# Altium schematic symbol library jlcpcb_2025_04_capacitors_extended_0402.schlib: 3594 symbols (part 8 of 20) (continued)
## CC0402JRNPO0BN220
designator C?  Capacitance: 22pF  (hidden comment: *)
Capacitor, Ceramic (MLCC), 22pF, ±5%, 100V, NP0, ±5%, SMD 0402; Manufacturer: YAGEO; Manufacturer Part Number: CC0402JRNPO0BN220; Package Size: 0402; JLCPCB Basic Part: No; JLCPCB Part Number: C576701; Supplier 1: LCSC; Category: Capacitors - MLCC; Supplier Part Number 1: C576701; Tolerance: ±5%; Voltage Rating: 100V; Temperature Coefficient: NP0; RoHS: Yes; ComponentLink1Description: Datasheet; ComponentLink1URL: https://wmsc.lcsc.com/wmsc/upload/file/pdf/v2/lcsc/2311211121_YAGEO-CC0402JRNPO0BN220_C576701.pdf; ComponentLink2Description: JLCPCB Part URL; ComponentLink2URL: https://jlcpcb.com/partdetail/C576701; ComponentLink3Description: LCSC Part URL; ComponentLink3URL: https://lcsc.com/product-detail/Multilayer-Ceramic-Capacitors-MLCC---SMD-SMT_YAGEO-YAGEO-CC0402JRNPO0BN220_C576701.html
footprint CAP-0402 (0402 (1005M) Capacitor)
pins: 1, 2

## CC0402JRNPO0BN470
designator C?  Capacitance: 47pF  (hidden comment: *)
Capacitor, Ceramic (MLCC), 47pF, ±5%, 100V, NP0, ±5%, SMD 0402; Manufacturer: YAGEO; Manufacturer Part Number: CC0402JRNPO0BN470; Package Size: 0402; JLCPCB Basic Part: No; JLCPCB Part Number: C576703; Supplier 1: LCSC; Category: Capacitors - MLCC; Supplier Part Number 1: C576703; Tolerance: ±5%; Voltage Rating: 100V; Temperature Coefficient: NP0; RoHS: Yes; ComponentLink1Description: Datasheet; ComponentLink1URL: https://wmsc.lcsc.com/wmsc/upload/file/pdf/v2/lcsc/2008171233_YAGEO-CC0402JRNPO0BN470_C576703.pdf; ComponentLink2Description: JLCPCB Part URL; ComponentLink2URL: https://jlcpcb.com/partdetail/C576703; ComponentLink3Description: LCSC Part URL; ComponentLink3URL: https://lcsc.com/product-detail/Multilayer-Ceramic-Capacitors-MLCC---SMD-SMT_YAGEO-YAGEO-CC0402JRNPO0BN470_C576703.html
footprint CAP-0402 (0402 (1005M) Capacitor)
pins: 1, 2

## CC0402JRNPO7BN101
designator C?  Capacitance: 100pF  (hidden comment: *)
Capacitor, Ceramic (MLCC), 100pF, ±5%, 16V, NP0, ±5%, SMD 0402; Manufacturer: YAGEO; Manufacturer Part Number: CC0402JRNPO7BN101; Package Size: 0402; JLCPCB Basic Part: No; JLCPCB Part Number: C526991; Supplier 1: LCSC; Category: Capacitors - MLCC; Supplier Part Number 1: C526991; Tolerance: ±5%; Voltage Rating: 16V; Temperature Coefficient: NP0; RoHS: Yes; ComponentLink1Description: Datasheet; ComponentLink1URL: https://wmsc.lcsc.com/wmsc/upload/file/pdf/v2/lcsc/2005261832_YAGEO-CC0402JRNPO7BN101_C526991.pdf; ComponentLink2Description: JLCPCB Part URL; ComponentLink2URL: https://jlcpcb.com/partdetail/C526991; ComponentLink3Description: LCSC Part URL; ComponentLink3URL: https://lcsc.com/product-detail/Multilayer-Ceramic-Capacitors-MLCC---SMD-SMT_YAGEO-YAGEO-CC0402JRNPO7BN101_C526991.html
footprint CAP-0402 (0402 (1005M) Capacitor)
pins: 1, 2

## CC0402JRNPO7BN120
designator C?  Capacitance: 12pF  (hidden comment: *)
Capacitor, Ceramic (MLCC), 12pF, ±5%, 16V, NP0, ±5%, SMD 0402; Manufacturer: YAGEO; Manufacturer Part Number: CC0402JRNPO7BN120; Package Size: 0402; JLCPCB Basic Part: No; JLCPCB Part Number: C1852904; Supplier 1: LCSC; Category: Capacitors - MLCC; Supplier Part Number 1: C1852904; Tolerance: ±5%; Voltage Rating: 16V; Temperature Coefficient: NP0; RoHS: Yes; ComponentLink1Description: Datasheet; ComponentLink1URL: https://wmsc.lcsc.com/wmsc/upload/file/pdf/v2/lcsc/2201271030_YAGEO-CC0402JRNPO7BN120_C1852904.pdf; ComponentLink2Description: JLCPCB Part URL; ComponentLink2URL: https://jlcpcb.com/partdetail/C1852904; ComponentLink3Description: LCSC Part URL; ComponentLink3URL: https://lcsc.com/product-detail/Multilayer-Ceramic-Capacitors-MLCC---SMD-SMT_YAGEO-YAGEO-CC0402JRNPO7BN120_C1852904.html
footprint CAP-0402 (0402 (1005M) Capacitor)
pins: 1, 2

## CC0402JRNPO7BN220
designator C?  Capacitance: 22pF  (hidden comment: *)
Capacitor, Ceramic (MLCC), 22pF, ±5%, 16V, NP0, ±5%, SMD 0402; Manufacturer: YAGEO; Manufacturer Part Number: CC0402JRNPO7BN220; Package Size: 0402; JLCPCB Basic Part: No; JLCPCB Part Number: C2175872; Supplier 1: LCSC; Category: Capacitors - MLCC; Supplier Part Number 1: C2175872; Tolerance: ±5%; Voltage Rating: 16V; Temperature Coefficient: NP0; RoHS: Yes; ComponentLink1Description: Datasheet; ComponentLink1URL: https://wmsc.lcsc.com/wmsc/upload/file/pdf/v2/lcsc/2202040800_YAGEO-CC0402JRNPO7BN220_C2175872.pdf; ComponentLink2Description: JLCPCB Part URL; ComponentLink2URL: https://jlcpcb.com/partdetail/C2175872; ComponentLink3Description: LCSC Part URL; ComponentLink3URL: https://lcsc.com/product-detail/Multilayer-Ceramic-Capacitors-MLCC---SMD-SMT_YAGEO-YAGEO-CC0402JRNPO7BN220_C2175872.html
footprint CAP-0402 (0402 (1005M) Capacitor)
pins: 1, 2

## CC0402JRNPO7BN331
designator C?  Capacitance: 330pF  (hidden comment: *)
Capacitor, Ceramic (MLCC), 330pF, ±5%, 16V, NP0, ±5%, SMD 0402; Manufacturer: YAGEO; Manufacturer Part Number: CC0402JRNPO7BN331; Package Size: 0402; JLCPCB Basic Part: No; JLCPCB Part Number: C541368; Supplier 1: LCSC; Category: Capacitors - MLCC; Supplier Part Number 1: C541368; Tolerance: ±5%; Voltage Rating: 16V; Temperature Coefficient: NP0; RoHS: Yes; ComponentLink1Description: Datasheet; ComponentLink1URL: https://wmsc.lcsc.com/wmsc/upload/file/pdf/v2/lcsc/2006151112_YAGEO-CC0402JRNPO7BN331_C541368.pdf; ComponentLink2Description: JLCPCB Part URL; ComponentLink2URL: https://jlcpcb.com/partdetail/C541368; ComponentLink3Description: LCSC Part URL; ComponentLink3URL: https://lcsc.com/product-detail/Multilayer-Ceramic-Capacitors-MLCC---SMD-SMT_YAGEO-YAGEO-CC0402JRNPO7BN331_C541368.html
footprint CAP-0402 (0402 (1005M) Capacitor)
pins: 1, 2

## CC0402JRNPO7BN391
designator C?  Capacitance: 390pF  (hidden comment: *)
Capacitor, Ceramic (MLCC), 390pF, ±5%, 16V, NP0, ±5%, SMD 0402; Manufacturer: YAGEO; Manufacturer Part Number: CC0402JRNPO7BN391; Package Size: 0402; JLCPCB Basic Part: No; JLCPCB Part Number: C526992; Supplier 1: LCSC; Category: Capacitors - MLCC; Supplier Part Number 1: C526992; Tolerance: ±5%; Voltage Rating: 16V; Temperature Coefficient: NP0; RoHS: Yes; ComponentLink1Description: Datasheet; ComponentLink1URL: https://wmsc.lcsc.com/wmsc/upload/file/pdf/v2/lcsc/2005261832_YAGEO-CC0402JRNPO7BN391_C526992.pdf; ComponentLink2Description: JLCPCB Part URL; ComponentLink2URL: https://jlcpcb.com/partdetail/C526992; ComponentLink3Description: LCSC Part URL; ComponentLink3URL: https://lcsc.com/product-detail/Multilayer-Ceramic-Capacitors-MLCC---SMD-SMT_YAGEO-YAGEO-CC0402JRNPO7BN391_C526992.html
footprint CAP-0402 (0402 (1005M) Capacitor)
pins: 1, 2

## CC0402JRNPO7BN471
designator C?  Capacitance: 470pF  (hidden comment: *)
Capacitor, Ceramic (MLCC), 470pF, ±5%, 16V, NP0, ±5%, SMD 0402; Manufacturer: YAGEO; Manufacturer Part Number: CC0402JRNPO7BN471; Package Size: 0402; JLCPCB Basic Part: No; JLCPCB Part Number: C526993; Supplier 1: LCSC; Category: Capacitors - MLCC; Supplier Part Number 1: C526993; Tolerance: ±5%; Voltage Rating: 16V; Temperature Coefficient: NP0; RoHS: Yes; ComponentLink1Description: Datasheet; ComponentLink1URL: https://wmsc.lcsc.com/wmsc/upload/file/pdf/v2/lcsc/2006031835_YAGEO-CC0402JRNPO7BN471_C526993.pdf; ComponentLink2Description: JLCPCB Part URL; ComponentLink2URL: https://jlcpcb.com/partdetail/C526993; ComponentLink3Description: LCSC Part URL; ComponentLink3URL: https://lcsc.com/product-detail/Multilayer-Ceramic-Capacitors-MLCC---SMD-SMT_YAGEO-YAGEO-CC0402JRNPO7BN471_C526993.html
footprint CAP-0402 (0402 (1005M) Capacitor)
pins: 1, 2

## CC0402JRNPO8BN100
designator C?  Capacitance: 10pF  (hidden comment: *)
Capacitor, Ceramic (MLCC), 10pF, ±5%, 25V, NP0, ±5%, SMD 0402; Manufacturer: YAGEO; Manufacturer Part Number: CC0402JRNPO8BN100; Package Size: 0402; JLCPCB Basic Part: No; JLCPCB Part Number: C526994; Supplier 1: LCSC; Category: Capacitors - MLCC; Supplier Part Number 1: C526994; Tolerance: ±5%; Voltage Rating: 25V; Temperature Coefficient: NP0; RoHS: Yes; ComponentLink1Description: Datasheet; ComponentLink1URL: https://wmsc.lcsc.com/wmsc/upload/file/pdf/v2/lcsc/2005261832_YAGEO-CC0402JRNPO8BN100_C526994.pdf; ComponentLink2Description: JLCPCB Part URL; ComponentLink2URL: https://jlcpcb.com/partdetail/C526994; ComponentLink3Description: LCSC Part URL; ComponentLink3URL: https://lcsc.com/product-detail/Multilayer-Ceramic-Capacitors-MLCC---SMD-SMT_YAGEO-YAGEO-CC0402JRNPO8BN100_C526994.html
footprint CAP-0402 (0402 (1005M) Capacitor)
pins: 1, 2

## CC0402JRNPO8BN101
designator C?  Capacitance: 100pF  (hidden comment: *)
Capacitor, Ceramic (MLCC), 100pF, ±5%, 25V, NP0, ±5%, SMD 0402; Manufacturer: YAGEO; Manufacturer Part Number: CC0402JRNPO8BN101; Package Size: 0402; JLCPCB Basic Part: No; JLCPCB Part Number: C541358; Supplier 1: LCSC; Category: Capacitors - MLCC; Supplier Part Number 1: C541358; Tolerance: ±5%; Voltage Rating: 25V; Temperature Coefficient: NP0; RoHS: Yes; ComponentLink1Description: Datasheet; ComponentLink1URL: https://wmsc.lcsc.com/wmsc/upload/file/pdf/v2/lcsc/2006151111_YAGEO-CC0402JRNPO8BN101_C541358.pdf; ComponentLink2Description: JLCPCB Part URL; ComponentLink2URL: https://jlcpcb.com/partdetail/C541358; ComponentLink3Description: LCSC Part URL; ComponentLink3URL: https://lcsc.com/product-detail/Multilayer-Ceramic-Capacitors-MLCC---SMD-SMT_YAGEO-YAGEO-CC0402JRNPO8BN101_C541358.html
footprint CAP-0402 (0402 (1005M) Capacitor)
pins: 1, 2

## CC0402JRNPO8BN102
designator C?  Capacitance: 1nF  (hidden comment: *)
Capacitor, Ceramic (MLCC), 1nF, ±5%, 25V, NP0, ±5%, SMD 0402; Manufacturer: YAGEO; Manufacturer Part Number: CC0402JRNPO8BN102; Package Size: 0402; JLCPCB Basic Part: No; JLCPCB Part Number: C526995; Supplier 1: LCSC; Category: Capacitors - MLCC; Supplier Part Number 1: C526995; Tolerance: ±5%; Voltage Rating: 25V; Temperature Coefficient: NP0; RoHS: Yes; ComponentLink1Description: Datasheet; ComponentLink1URL: https://wmsc.lcsc.com/wmsc/upload/file/pdf/v2/lcsc/2005141733_YAGEO-CC0402JRNPO8BN102_C526995.pdf; ComponentLink2Description: JLCPCB Part URL; ComponentLink2URL: https://jlcpcb.com/partdetail/C526995; ComponentLink3Description: LCSC Part URL; ComponentLink3URL: https://lcsc.com/product-detail/Multilayer-Ceramic-Capacitors-MLCC---SMD-SMT_YAGEO-YAGEO-CC0402JRNPO8BN102_C526995.html
footprint CAP-0402 (0402 (1005M) Capacitor)
pins: 1, 2

## CC0402JRNPO8BN150
designator C?  Capacitance: 15pF  (hidden comment: *)
Capacitor, Ceramic (MLCC), 15pF, ±5%, 25V, NP0, ±5%, SMD 0402; Manufacturer: YAGEO; Manufacturer Part Number: CC0402JRNPO8BN150; Package Size: 0402; JLCPCB Basic Part: No; JLCPCB Part Number: C541359; Supplier 1: LCSC; Category: Capacitors - MLCC; Supplier Part Number 1: C541359; Tolerance: ±5%; Voltage Rating: 25V; Temperature Coefficient: NP0; RoHS: Yes; ComponentLink1Description: Datasheet; ComponentLink1URL: https://wmsc.lcsc.com/wmsc/upload/file/pdf/v2/lcsc/2006151111_YAGEO-CC0402JRNPO8BN150_C541359.pdf; ComponentLink2Description: JLCPCB Part URL; ComponentLink2URL: https://jlcpcb.com/partdetail/C541359; ComponentLink3Description: LCSC Part URL; ComponentLink3URL: https://lcsc.com/product-detail/Multilayer-Ceramic-Capacitors-MLCC---SMD-SMT_YAGEO-YAGEO-CC0402JRNPO8BN150_C541359.html
footprint CAP-0402 (0402 (1005M) Capacitor)
pins: 1, 2

## CC0402JRNPO8BN151
designator C?  Capacitance: 150pF  (hidden comment: *)
Capacitor, Ceramic (MLCC), 150pF, ±5%, 25V, NP0, ±5%, SMD 0402; Manufacturer: YAGEO; Manufacturer Part Number: CC0402JRNPO8BN151; Package Size: 0402; JLCPCB Basic Part: No; JLCPCB Part Number: C541366; Supplier 1: LCSC; Category: Capacitors - MLCC; Supplier Part Number 1: C541366; Tolerance: ±5%; Voltage Rating: 25V; Temperature Coefficient: NP0; RoHS: Yes; ComponentLink1Description: Datasheet; ComponentLink1URL: https://wmsc.lcsc.com/wmsc/upload/file/pdf/v2/lcsc/2006151112_YAGEO-CC0402JRNPO8BN151_C541366.pdf; ComponentLink2Description: JLCPCB Part URL; ComponentLink2URL: https://jlcpcb.com/partdetail/C541366; ComponentLink3Description: LCSC Part URL; ComponentLink3URL: https://lcsc.com/product-detail/Multilayer-Ceramic-Capacitors-MLCC---SMD-SMT_YAGEO-YAGEO-CC0402JRNPO8BN151_C541366.html
footprint CAP-0402 (0402 (1005M) Capacitor)
pins: 1, 2

## CC0402JRNPO8BN180
designator C?  Capacitance: 18pF  (hidden comment: *)
Capacitor, Ceramic (MLCC), 18pF, ±5%, 25V, NP0, ±5%, SMD 0402; Manufacturer: YAGEO; Manufacturer Part Number: CC0402JRNPO8BN180; Package Size: 0402; JLCPCB Basic Part: No; JLCPCB Part Number: C541360; Supplier 1: LCSC; Category: Capacitors - MLCC; Supplier Part Number 1: C541360; Tolerance: ±5%; Voltage Rating: 25V; Temperature Coefficient: NP0; RoHS: Yes; ComponentLink1Description: Datasheet; ComponentLink1URL: https://wmsc.lcsc.com/wmsc/upload/file/pdf/v2/lcsc/2006151111_YAGEO-CC0402JRNPO8BN180_C541360.pdf; ComponentLink2Description: JLCPCB Part URL; ComponentLink2URL: https://jlcpcb.com/partdetail/C541360; ComponentLink3Description: LCSC Part URL; ComponentLink3URL: https://lcsc.com/product-detail/Multilayer-Ceramic-Capacitors-MLCC---SMD-SMT_YAGEO-YAGEO-CC0402JRNPO8BN180_C541360.html
footprint CAP-0402 (0402 (1005M) Capacitor)
pins: 1, 2

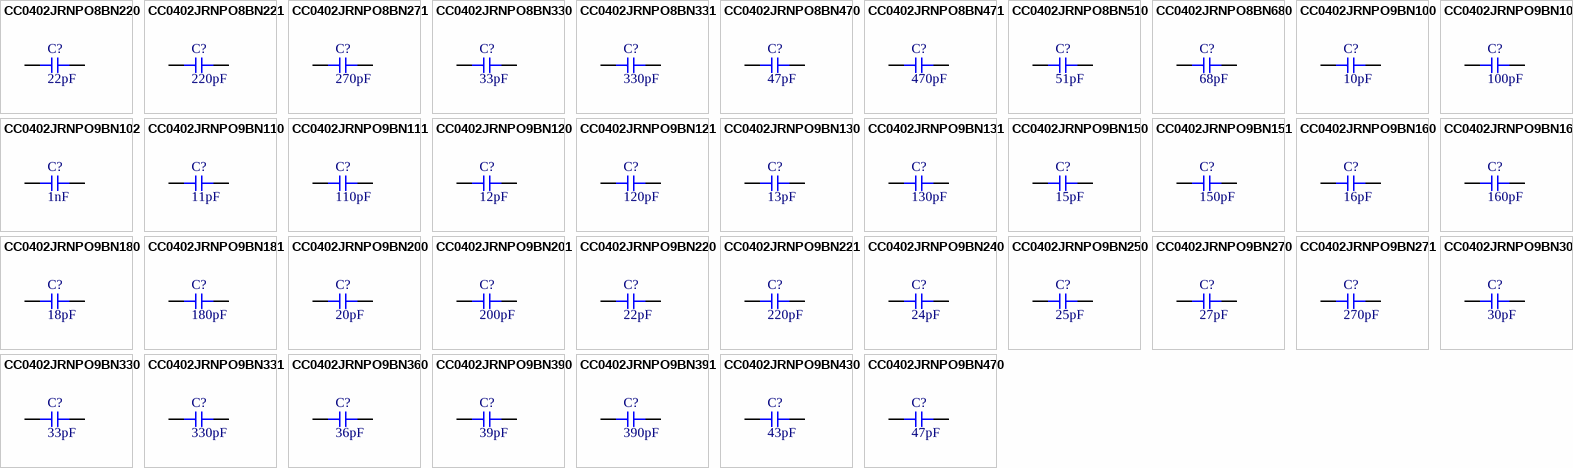
[diagram p34: symbols CC0402JRNPO8BN220 to CC0402JRNPO9BN470]

## CC0402JRNPO8BN220
designator C?  Capacitance: 22pF  (hidden comment: *)
Capacitor, Ceramic (MLCC), 22pF, ±5%, 25V, NP0, ±5%, SMD 0402; Manufacturer: YAGEO; Manufacturer Part Number: CC0402JRNPO8BN220; Package Size: 0402; JLCPCB Basic Part: No; JLCPCB Part Number: C541361; Supplier 1: LCSC; Category: Capacitors - MLCC; Supplier Part Number 1: C541361; Tolerance: ±5%; Voltage Rating: 25V; Temperature Coefficient: NP0; RoHS: Yes; ComponentLink1Description: Datasheet; ComponentLink1URL: https://wmsc.lcsc.com/wmsc/upload/file/pdf/v2/lcsc/2006151111_YAGEO-CC0402JRNPO8BN220_C541361.pdf; ComponentLink2Description: JLCPCB Part URL; ComponentLink2URL: https://jlcpcb.com/partdetail/C541361; ComponentLink3Description: LCSC Part URL; ComponentLink3URL: https://lcsc.com/product-detail/Multilayer-Ceramic-Capacitors-MLCC---SMD-SMT_YAGEO-YAGEO-CC0402JRNPO8BN220_C541361.html
footprint CAP-0402 (0402 (1005M) Capacitor)
pins: 1, 2

## CC0402JRNPO8BN221
designator C?  Capacitance: 220pF  (hidden comment: *)
Capacitor, Ceramic (MLCC), 220pF, ±5%, 25V, NP0, ±5%, SMD 0402; Manufacturer: YAGEO; Manufacturer Part Number: CC0402JRNPO8BN221; Package Size: 0402; JLCPCB Basic Part: No; JLCPCB Part Number: C541367; Supplier 1: LCSC; Category: Capacitors - MLCC; Supplier Part Number 1: C541367; Tolerance: ±5%; Voltage Rating: 25V; Temperature Coefficient: NP0; RoHS: Yes; ComponentLink1Description: Datasheet; ComponentLink1URL: https://wmsc.lcsc.com/wmsc/upload/file/pdf/v2/lcsc/2006151112_YAGEO-CC0402JRNPO8BN221_C541367.pdf; ComponentLink2Description: JLCPCB Part URL; ComponentLink2URL: https://jlcpcb.com/partdetail/C541367; ComponentLink3Description: LCSC Part URL; ComponentLink3URL: https://lcsc.com/product-detail/Multilayer-Ceramic-Capacitors-MLCC---SMD-SMT_YAGEO-YAGEO-CC0402JRNPO8BN221_C541367.html
footprint CAP-0402 (0402 (1005M) Capacitor)
pins: 1, 2

## CC0402JRNPO8BN271
designator C?  Capacitance: 270pF  (hidden comment: *)
Capacitor, Ceramic (MLCC), 270pF, ±5%, 25V, NP0, ±5%, SMD 0402; Manufacturer: YAGEO; Manufacturer Part Number: CC0402JRNPO8BN271; Package Size: 0402; JLCPCB Basic Part: No; JLCPCB Part Number: C354976; Supplier 1: LCSC; Category: Capacitors - MLCC; Supplier Part Number 1: C354976; Tolerance: ±5%; Voltage Rating: 25V; Temperature Coefficient: NP0; RoHS: Yes; ComponentLink1Description: Datasheet; ComponentLink1URL: https://wmsc.lcsc.com/wmsc/upload/file/pdf/v2/lcsc/2003251632_YAGEO-CC0402JRNPO8BN271_C354976.pdf; ComponentLink2Description: JLCPCB Part URL; ComponentLink2URL: https://jlcpcb.com/partdetail/C354976; ComponentLink3Description: LCSC Part URL; ComponentLink3URL: https://lcsc.com/product-detail/Multilayer-Ceramic-Capacitors-MLCC---SMD-SMT_YAGEO-YAGEO-CC0402JRNPO8BN271_C354976.html
footprint CAP-0402 (0402 (1005M) Capacitor)
pins: 1, 2

## CC0402JRNPO8BN330
designator C?  Capacitance: 33pF  (hidden comment: *)
Capacitor, Ceramic (MLCC), 33pF, ±5%, 25V, NP0, ±5%, SMD 0402; Manufacturer: YAGEO; Manufacturer Part Number: CC0402JRNPO8BN330; Package Size: 0402; JLCPCB Basic Part: No; JLCPCB Part Number: C526997; Supplier 1: LCSC; Category: Capacitors - MLCC; Supplier Part Number 1: C526997; Tolerance: ±5%; Voltage Rating: 25V; Temperature Coefficient: NP0; RoHS: Yes; ComponentLink1Description: Datasheet; ComponentLink1URL: https://wmsc.lcsc.com/wmsc/upload/file/pdf/v2/lcsc/2005262133_YAGEO-CC0402JRNPO8BN330_C526997.pdf; ComponentLink2Description: JLCPCB Part URL; ComponentLink2URL: https://jlcpcb.com/partdetail/C526997; ComponentLink3Description: LCSC Part URL; ComponentLink3URL: https://lcsc.com/product-detail/Multilayer-Ceramic-Capacitors-MLCC---SMD-SMT_YAGEO-YAGEO-CC0402JRNPO8BN330_C526997.html
footprint CAP-0402 (0402 (1005M) Capacitor)
pins: 1, 2

## CC0402JRNPO8BN331
designator C?  Capacitance: 330pF  (hidden comment: *)
Capacitor, Ceramic (MLCC), 330pF, ±5%, 25V, NP0, ±5%, SMD 0402; Manufacturer: YAGEO; Manufacturer Part Number: CC0402JRNPO8BN331; Package Size: 0402; JLCPCB Basic Part: No; JLCPCB Part Number: C526998; Supplier 1: LCSC; Category: Capacitors - MLCC; Supplier Part Number 1: C526998; Tolerance: ±5%; Voltage Rating: 25V; Temperature Coefficient: NP0; RoHS: Yes; ComponentLink1Description: Datasheet; ComponentLink1URL: https://wmsc.lcsc.com/wmsc/upload/file/pdf/v2/lcsc/2006031835_YAGEO-CC0402JRNPO8BN331_C526998.pdf; ComponentLink2Description: JLCPCB Part URL; ComponentLink2URL: https://jlcpcb.com/partdetail/C526998; ComponentLink3Description: LCSC Part URL; ComponentLink3URL: https://lcsc.com/product-detail/Multilayer-Ceramic-Capacitors-MLCC---SMD-SMT_YAGEO-YAGEO-CC0402JRNPO8BN331_C526998.html
footprint CAP-0402 (0402 (1005M) Capacitor)
pins: 1, 2

## CC0402JRNPO8BN470
designator C?  Capacitance: 47pF  (hidden comment: *)
Capacitor, Ceramic (MLCC), 47pF, ±5%, 25V, NP0, ±5%, SMD 0402; Manufacturer: YAGEO; Manufacturer Part Number: CC0402JRNPO8BN470; Package Size: 0402; JLCPCB Basic Part: No; JLCPCB Part Number: C541362; Supplier 1: LCSC; Category: Capacitors - MLCC; Supplier Part Number 1: C541362; Tolerance: ±5%; Voltage Rating: 25V; Temperature Coefficient: NP0; RoHS: Yes; ComponentLink1Description: Datasheet; ComponentLink1URL: https://wmsc.lcsc.com/wmsc/upload/file/pdf/v2/lcsc/2006151111_YAGEO-CC0402JRNPO8BN470_C541362.pdf; ComponentLink2Description: JLCPCB Part URL; ComponentLink2URL: https://jlcpcb.com/partdetail/C541362; ComponentLink3Description: LCSC Part URL; ComponentLink3URL: https://lcsc.com/product-detail/Multilayer-Ceramic-Capacitors-MLCC---SMD-SMT_YAGEO-YAGEO-CC0402JRNPO8BN470_C541362.html
footprint CAP-0402 (0402 (1005M) Capacitor)
pins: 1, 2

## CC0402JRNPO8BN471
designator C?  Capacitance: 470pF  (hidden comment: *)
Capacitor, Ceramic (MLCC), 470pF, ±5%, 25V, NP0, ±5%, SMD 0402; Manufacturer: YAGEO; Manufacturer Part Number: CC0402JRNPO8BN471; Package Size: 0402; JLCPCB Basic Part: No; JLCPCB Part Number: C541369; Supplier 1: LCSC; Category: Capacitors - MLCC; Supplier Part Number 1: C541369; Tolerance: ±5%; Voltage Rating: 25V; Temperature Coefficient: NP0; RoHS: Yes; ComponentLink1Description: Datasheet; ComponentLink1URL: https://wmsc.lcsc.com/wmsc/upload/file/pdf/v2/lcsc/2006151112_YAGEO-CC0402JRNPO8BN471_C541369.pdf; ComponentLink2Description: JLCPCB Part URL; ComponentLink2URL: https://jlcpcb.com/partdetail/C541369; ComponentLink3Description: LCSC Part URL; ComponentLink3URL: https://lcsc.com/product-detail/Multilayer-Ceramic-Capacitors-MLCC---SMD-SMT_YAGEO-YAGEO-CC0402JRNPO8BN471_C541369.html
footprint CAP-0402 (0402 (1005M) Capacitor)
pins: 1, 2

## CC0402JRNPO8BN510
designator C?  Capacitance: 51pF  (hidden comment: *)
Capacitor, Ceramic (MLCC), 51pF, ±5%, 25V, NP0, ±5%, SMD 0402; Manufacturer: YAGEO; Manufacturer Part Number: CC0402JRNPO8BN510; Package Size: 0402; JLCPCB Basic Part: No; JLCPCB Part Number: C2193742; Supplier 1: LCSC; Category: Capacitors - MLCC; Supplier Part Number 1: C2193742; Tolerance: ±5%; Voltage Rating: 25V; Temperature Coefficient: NP0; RoHS: Yes; ComponentLink1Description: Datasheet; ComponentLink1URL: https://wmsc.lcsc.com/wmsc/upload/file/pdf/v2/lcsc/2304140030_YAGEO-CC0402JRNPO8BN510_C2193742.pdf; ComponentLink2Description: JLCPCB Part URL; ComponentLink2URL: https://jlcpcb.com/partdetail/C2193742; ComponentLink3Description: LCSC Part URL; ComponentLink3URL: https://lcsc.com/product-detail/Multilayer-Ceramic-Capacitors-MLCC---SMD-SMT_YAGEO-YAGEO-CC0402JRNPO8BN510_C2193742.html
footprint CAP-0402 (0402 (1005M) Capacitor)
pins: 1, 2

## CC0402JRNPO8BN680
designator C?  Capacitance: 68pF  (hidden comment: *)
Capacitor, Ceramic (MLCC), 68pF, ±5%, 25V, NP0, ±5%, SMD 0402; Manufacturer: YAGEO; Manufacturer Part Number: CC0402JRNPO8BN680; Package Size: 0402; JLCPCB Basic Part: No; JLCPCB Part Number: C526999; Supplier 1: LCSC; Category: Capacitors - MLCC; Supplier Part Number 1: C526999; Tolerance: ±5%; Voltage Rating: 25V; Temperature Coefficient: NP0; RoHS: Yes; ComponentLink1Description: Datasheet; ComponentLink1URL: https://wmsc.lcsc.com/wmsc/upload/file/pdf/v2/lcsc/2006031835_YAGEO-CC0402JRNPO8BN680_C526999.pdf; ComponentLink2Description: JLCPCB Part URL; ComponentLink2URL: https://jlcpcb.com/partdetail/C526999; ComponentLink3Description: LCSC Part URL; ComponentLink3URL: https://lcsc.com/product-detail/Multilayer-Ceramic-Capacitors-MLCC---SMD-SMT_YAGEO-YAGEO-CC0402JRNPO8BN680_C526999.html
footprint CAP-0402 (0402 (1005M) Capacitor)
pins: 1, 2

## CC0402JRNPO9BN100
designator C?  Capacitance: 10pF  (hidden comment: *)
Capacitor, Ceramic (MLCC), 10pF, ±5%, 50V, NP0, ±5%, SMD 0402; Manufacturer: YAGEO; Manufacturer Part Number: CC0402JRNPO9BN100; Package Size: 0402; JLCPCB Basic Part: No; JLCPCB Part Number: C106199; Supplier 1: LCSC; Category: Capacitors - MLCC; Supplier Part Number 1: C106199; Tolerance: ±5%; Voltage Rating: 50V; Temperature Coefficient: NP0; RoHS: Yes; ComponentLink1Description: Datasheet; ComponentLink1URL: https://wmsc.lcsc.com/wmsc/upload/file/pdf/v2/lcsc/2304140030_YAGEO-CC0402JRNPO9BN100_C106199.pdf; ComponentLink2Description: JLCPCB Part URL; ComponentLink2URL: https://jlcpcb.com/partdetail/C106199; ComponentLink3Description: LCSC Part URL; ComponentLink3URL: https://lcsc.com/product-detail/Multilayer-Ceramic-Capacitors-MLCC---SMD-SMT_YAGEO-YAGEO-CC0402JRNPO9BN100_C106199.html
footprint CAP-0402 (0402 (1005M) Capacitor)
pins: 1, 2

## CC0402JRNPO9BN101
designator C?  Capacitance: 100pF  (hidden comment: *)
Capacitor, Ceramic (MLCC), 100pF, ±5%, 50V, NP0, ±5%, SMD 0402; Manufacturer: YAGEO; Manufacturer Part Number: CC0402JRNPO9BN101; Package Size: 0402; JLCPCB Basic Part: No; JLCPCB Part Number: C106200; Supplier 1: LCSC; Category: Capacitors - MLCC; Supplier Part Number 1: C106200; Tolerance: ±5%; Voltage Rating: 50V; Temperature Coefficient: NP0; RoHS: Yes; ComponentLink1Description: Datasheet; ComponentLink1URL: https://wmsc.lcsc.com/wmsc/upload/file/pdf/v2/lcsc/2304140030_YAGEO-CC0402JRNPO9BN101_C106200.pdf; ComponentLink2Description: JLCPCB Part URL; ComponentLink2URL: https://jlcpcb.com/partdetail/C106200; ComponentLink3Description: LCSC Part URL; ComponentLink3URL: https://lcsc.com/product-detail/Multilayer-Ceramic-Capacitors-MLCC---SMD-SMT_YAGEO-YAGEO-CC0402JRNPO9BN101_C106200.html
footprint CAP-0402 (0402 (1005M) Capacitor)
pins: 1, 2

## CC0402JRNPO9BN102
designator C?  Capacitance: 1nF  (hidden comment: *)
Capacitor, Ceramic (MLCC), 1nF, ±5%, 50V, NP0, ±5%, SMD 0402; Manufacturer: YAGEO; Manufacturer Part Number: CC0402JRNPO9BN102; Package Size: 0402; JLCPCB Basic Part: No; JLCPCB Part Number: C113780; Supplier 1: LCSC; Category: Capacitors - MLCC; Supplier Part Number 1: C113780; Tolerance: ±5%; Voltage Rating: 50V; Temperature Coefficient: NP0; RoHS: Yes; ComponentLink1Description: Datasheet; ComponentLink1URL: https://wmsc.lcsc.com/wmsc/upload/file/pdf/v2/lcsc/2304140030_YAGEO-CC0402JRNPO9BN102_C113780.pdf; ComponentLink2Description: JLCPCB Part URL; ComponentLink2URL: https://jlcpcb.com/partdetail/C113780; ComponentLink3Description: LCSC Part URL; ComponentLink3URL: https://lcsc.com/product-detail/Multilayer-Ceramic-Capacitors-MLCC---SMD-SMT_YAGEO-YAGEO-CC0402JRNPO9BN102_C113780.html
footprint CAP-0402 (0402 (1005M) Capacitor)
pins: 1, 2

## CC0402JRNPO9BN110
designator C?  Capacitance: 11pF  (hidden comment: *)
Capacitor, Ceramic (MLCC), 11pF, ±5%, 50V, NP0, ±5%, SMD 0402; Manufacturer: YAGEO; Manufacturer Part Number: CC0402JRNPO9BN110; Package Size: 0402; JLCPCB Basic Part: No; JLCPCB Part Number: C527000; Supplier 1: LCSC; Category: Capacitors - MLCC; Supplier Part Number 1: C527000; Tolerance: ±5%; Voltage Rating: 50V; Temperature Coefficient: NP0; RoHS: Yes; ComponentLink1Description: Datasheet; ComponentLink1URL: https://wmsc.lcsc.com/wmsc/upload/file/pdf/v2/lcsc/2005261832_YAGEO-CC0402JRNPO9BN110_C527000.pdf; ComponentLink2Description: JLCPCB Part URL; ComponentLink2URL: https://jlcpcb.com/partdetail/C527000; ComponentLink3Description: LCSC Part URL; ComponentLink3URL: https://lcsc.com/product-detail/Multilayer-Ceramic-Capacitors-MLCC---SMD-SMT_YAGEO-YAGEO-CC0402JRNPO9BN110_C527000.html
footprint CAP-0402 (0402 (1005M) Capacitor)
pins: 1, 2

## CC0402JRNPO9BN111
designator C?  Capacitance: 110pF  (hidden comment: *)
Capacitor, Ceramic (MLCC), 110pF, ±5%, 50V, NP0, ±5%, SMD 0402; Manufacturer: YAGEO; Manufacturer Part Number: CC0402JRNPO9BN111; Package Size: 0402; JLCPCB Basic Part: No; JLCPCB Part Number: C576704; Supplier 1: LCSC; Category: Capacitors - MLCC; Supplier Part Number 1: C576704; Tolerance: ±5%; Voltage Rating: 50V; Temperature Coefficient: NP0; RoHS: Yes; ComponentLink1Description: Datasheet; ComponentLink1URL: https://wmsc.lcsc.com/wmsc/upload/file/pdf/v2/lcsc/2204021130_YAGEO-CC0402JRNPO9BN111_C576704.pdf; ComponentLink2Description: JLCPCB Part URL; ComponentLink2URL: https://jlcpcb.com/partdetail/C576704; ComponentLink3Description: LCSC Part URL; ComponentLink3URL: https://lcsc.com/product-detail/Multilayer-Ceramic-Capacitors-MLCC---SMD-SMT_YAGEO-YAGEO-CC0402JRNPO9BN111_C576704.html
footprint CAP-0402 (0402 (1005M) Capacitor)
pins: 1, 2

## CC0402JRNPO9BN120
designator C?  Capacitance: 12pF  (hidden comment: *)
Capacitor, Ceramic (MLCC), 12pF, ±5%, 50V, NP0, ±5%, SMD 0402; Manufacturer: YAGEO; Manufacturer Part Number: CC0402JRNPO9BN120; Package Size: 0402; JLCPCB Basic Part: No; JLCPCB Part Number: C106201; Supplier 1: LCSC; Category: Capacitors - MLCC; Supplier Part Number 1: C106201; Tolerance: ±5%; Voltage Rating: 50V; Temperature Coefficient: NP0; RoHS: Yes; ComponentLink1Description: Datasheet; ComponentLink1URL: https://wmsc.lcsc.com/wmsc/upload/file/pdf/v2/lcsc/2304140030_YAGEO-CC0402JRNPO9BN120_C106201.pdf; ComponentLink2Description: JLCPCB Part URL; ComponentLink2URL: https://jlcpcb.com/partdetail/C106201; ComponentLink3Description: LCSC Part URL; ComponentLink3URL: https://lcsc.com/product-detail/Multilayer-Ceramic-Capacitors-MLCC---SMD-SMT_YAGEO-YAGEO-CC0402JRNPO9BN120_C106201.html
footprint CAP-0402 (0402 (1005M) Capacitor)
pins: 1, 2

## CC0402JRNPO9BN121
designator C?  Capacitance: 120pF  (hidden comment: *)
Capacitor, Ceramic (MLCC), 120pF, ±5%, 50V, NP0, ±5%, SMD 0402; Manufacturer: YAGEO; Manufacturer Part Number: CC0402JRNPO9BN121; Package Size: 0402; JLCPCB Basic Part: No; JLCPCB Part Number: C106996; Supplier 1: LCSC; Category: Capacitors - MLCC; Supplier Part Number 1: C106996; Tolerance: ±5%; Voltage Rating: 50V; Temperature Coefficient: NP0; RoHS: Yes; ComponentLink1Description: Datasheet; ComponentLink1URL: https://wmsc.lcsc.com/wmsc/upload/file/pdf/v2/lcsc/2304140030_YAGEO-CC0402JRNPO9BN121_C106996.pdf; ComponentLink2Description: JLCPCB Part URL; ComponentLink2URL: https://jlcpcb.com/partdetail/C106996; ComponentLink3Description: LCSC Part URL; ComponentLink3URL: https://lcsc.com/product-detail/Multilayer-Ceramic-Capacitors-MLCC---SMD-SMT_YAGEO-YAGEO-CC0402JRNPO9BN121_C106996.html
footprint CAP-0402 (0402 (1005M) Capacitor)
pins: 1, 2

## CC0402JRNPO9BN130
designator C?  Capacitance: 13pF  (hidden comment: *)
Capacitor, Ceramic (MLCC), 13pF, ±5%, 50V, NP0, ±5%, SMD 0402; Manufacturer: YAGEO; Manufacturer Part Number: CC0402JRNPO9BN130; Package Size: 0402; JLCPCB Basic Part: No; JLCPCB Part Number: C130119; Supplier 1: LCSC; Category: Capacitors - MLCC; Supplier Part Number 1: C130119; Tolerance: ±5%; Voltage Rating: 50V; Temperature Coefficient: NP0; RoHS: Yes; ComponentLink1Description: Datasheet; ComponentLink1URL: https://wmsc.lcsc.com/wmsc/upload/file/pdf/v2/lcsc/2007151105_YAGEO-CC0402JRNPO9BN130_C130119.pdf; ComponentLink2Description: JLCPCB Part URL; ComponentLink2URL: https://jlcpcb.com/partdetail/C130119; ComponentLink3Description: LCSC Part URL; ComponentLink3URL: https://lcsc.com/product-detail/Multilayer-Ceramic-Capacitors-MLCC---SMD-SMT_YAGEO-YAGEO-CC0402JRNPO9BN130_C130119.html
footprint CAP-0402 (0402 (1005M) Capacitor)
pins: 1, 2

## CC0402JRNPO9BN131
designator C?  Capacitance: 130pF  (hidden comment: *)
Capacitor, Ceramic (MLCC), 130pF, ±5%, 50V, NP0, ±5%, SMD 0402; Manufacturer: YAGEO; Manufacturer Part Number: CC0402JRNPO9BN131; Package Size: 0402; JLCPCB Basic Part: No; JLCPCB Part Number: C576705; Supplier 1: LCSC; Category: Capacitors - MLCC; Supplier Part Number 1: C576705; Tolerance: ±5%; Voltage Rating: 50V; Temperature Coefficient: NP0; RoHS: Yes; ComponentLink1Description: Datasheet; ComponentLink1URL: https://wmsc.lcsc.com/wmsc/upload/file/pdf/v2/lcsc/2203101903_YAGEO-CC0402JRNPO9BN131_C576705.pdf; ComponentLink2Description: JLCPCB Part URL; ComponentLink2URL: https://jlcpcb.com/partdetail/C576705; ComponentLink3Description: LCSC Part URL; ComponentLink3URL: https://lcsc.com/product-detail/Multilayer-Ceramic-Capacitors-MLCC---SMD-SMT_YAGEO-YAGEO-CC0402JRNPO9BN131_C576705.html
footprint CAP-0402 (0402 (1005M) Capacitor)
pins: 1, 2

## CC0402JRNPO9BN150
designator C?  Capacitance: 15pF  (hidden comment: *)
Capacitor, Ceramic (MLCC), 15pF, ±5%, 50V, NP0, ±5%, SMD 0402; Manufacturer: YAGEO; Manufacturer Part Number: CC0402JRNPO9BN150; Package Size: 0402; JLCPCB Basic Part: No; JLCPCB Part Number: C106997; Supplier 1: LCSC; Category: Capacitors - MLCC; Supplier Part Number 1: C106997; Tolerance: ±5%; Voltage Rating: 50V; Temperature Coefficient: NP0; RoHS: Yes; ComponentLink1Description: Datasheet; ComponentLink1URL: https://wmsc.lcsc.com/wmsc/upload/file/pdf/v2/lcsc/2304140030_YAGEO-CC0402JRNPO9BN150_C106997.pdf; ComponentLink2Description: JLCPCB Part URL; ComponentLink2URL: https://jlcpcb.com/partdetail/C106997; ComponentLink3Description: LCSC Part URL; ComponentLink3URL: https://lcsc.com/product-detail/Multilayer-Ceramic-Capacitors-MLCC---SMD-SMT_YAGEO-YAGEO-CC0402JRNPO9BN150_C106997.html
footprint CAP-0402 (0402 (1005M) Capacitor)
pins: 1, 2

## CC0402JRNPO9BN151
designator C?  Capacitance: 150pF  (hidden comment: *)
Capacitor, Ceramic (MLCC), 150pF, ±5%, 50V, NP0, ±5%, SMD 0402; Manufacturer: YAGEO; Manufacturer Part Number: CC0402JRNPO9BN151; Package Size: 0402; JLCPCB Basic Part: No; JLCPCB Part Number: C106998; Supplier 1: LCSC; Category: Capacitors - MLCC; Supplier Part Number 1: C106998; Tolerance: ±5%; Voltage Rating: 50V; Temperature Coefficient: NP0; RoHS: Yes; ComponentLink1Description: Datasheet; ComponentLink1URL: https://wmsc.lcsc.com/wmsc/upload/file/pdf/v2/lcsc/2304140030_YAGEO-CC0402JRNPO9BN151_C106998.pdf; ComponentLink2Description: JLCPCB Part URL; ComponentLink2URL: https://jlcpcb.com/partdetail/C106998; ComponentLink3Description: LCSC Part URL; ComponentLink3URL: https://lcsc.com/product-detail/Multilayer-Ceramic-Capacitors-MLCC---SMD-SMT_YAGEO-YAGEO-CC0402JRNPO9BN151_C106998.html
footprint CAP-0402 (0402 (1005M) Capacitor)
pins: 1, 2

## CC0402JRNPO9BN160
designator C?  Capacitance: 16pF  (hidden comment: *)
Capacitor, Ceramic (MLCC), 16pF, ±5%, 50V, NP0, ±5%, SMD 0402; Manufacturer: YAGEO; Manufacturer Part Number: CC0402JRNPO9BN160; Package Size: 0402; JLCPCB Basic Part: No; JLCPCB Part Number: C77590; Supplier 1: LCSC; Category: Capacitors - MLCC; Supplier Part Number 1: C77590; Tolerance: ±5%; Voltage Rating: 50V; Temperature Coefficient: NP0; RoHS: Yes; ComponentLink1Description: Datasheet; ComponentLink1URL: https://wmsc.lcsc.com/wmsc/upload/file/pdf/v2/lcsc/2304140030_YAGEO-CC0402JRNPO9BN160_C77590.pdf; ComponentLink2Description: JLCPCB Part URL; ComponentLink2URL: https://jlcpcb.com/partdetail/C77590; ComponentLink3Description: LCSC Part URL; ComponentLink3URL: https://lcsc.com/product-detail/Multilayer-Ceramic-Capacitors-MLCC---SMD-SMT_YAGEO-YAGEO-CC0402JRNPO9BN160_C77590.html
footprint CAP-0402 (0402 (1005M) Capacitor)
pins: 1, 2

## CC0402JRNPO9BN161
designator C?  Capacitance: 160pF  (hidden comment: *)
Capacitor, Ceramic (MLCC), 160pF, ±5%, 50V, NP0, ±5%, SMD 0402; Manufacturer: YAGEO; Manufacturer Part Number: CC0402JRNPO9BN161; Package Size: 0402; JLCPCB Basic Part: No; JLCPCB Part Number: C576706; Supplier 1: LCSC; Category: Capacitors - MLCC; Supplier Part Number 1: C576706; Tolerance: ±5%; Voltage Rating: 50V; Temperature Coefficient: NP0; RoHS: Yes; ComponentLink1Description: Datasheet; ComponentLink1URL: https://wmsc.lcsc.com/wmsc/upload/file/pdf/v2/lcsc/2204021130_YAGEO-CC0402JRNPO9BN161_C576706.pdf; ComponentLink2Description: JLCPCB Part URL; ComponentLink2URL: https://jlcpcb.com/partdetail/C576706; ComponentLink3Description: LCSC Part URL; ComponentLink3URL: https://lcsc.com/product-detail/Multilayer-Ceramic-Capacitors-MLCC---SMD-SMT_YAGEO-YAGEO-CC0402JRNPO9BN161_C576706.html
footprint CAP-0402 (0402 (1005M) Capacitor)
pins: 1, 2

## CC0402JRNPO9BN180
designator C?  Capacitance: 18pF  (hidden comment: *)
Capacitor, Ceramic (MLCC), 18pF, ±5%, 50V, NP0, ±5%, SMD 0402; Manufacturer: YAGEO; Manufacturer Part Number: CC0402JRNPO9BN180; Package Size: 0402; JLCPCB Basic Part: No; JLCPCB Part Number: C106202; Supplier 1: LCSC; Category: Capacitors - MLCC; Supplier Part Number 1: C106202; Tolerance: ±5%; Voltage Rating: 50V; Temperature Coefficient: NP0; RoHS: Yes; ComponentLink1Description: Datasheet; ComponentLink1URL: https://wmsc.lcsc.com/wmsc/upload/file/pdf/v2/lcsc/2304140030_YAGEO-CC0402JRNPO9BN180_C106202.pdf; ComponentLink2Description: JLCPCB Part URL; ComponentLink2URL: https://jlcpcb.com/partdetail/C106202; ComponentLink3Description: LCSC Part URL; ComponentLink3URL: https://lcsc.com/product-detail/Multilayer-Ceramic-Capacitors-MLCC---SMD-SMT_YAGEO-YAGEO-CC0402JRNPO9BN180_C106202.html
footprint CAP-0402 (0402 (1005M) Capacitor)
pins: 1, 2

## CC0402JRNPO9BN181
designator C?  Capacitance: 180pF  (hidden comment: *)
Capacitor, Ceramic (MLCC), 180pF, ±5%, 50V, NP0, ±5%, SMD 0402; Manufacturer: YAGEO; Manufacturer Part Number: CC0402JRNPO9BN181; Package Size: 0402; JLCPCB Basic Part: No; JLCPCB Part Number: C106999; Supplier 1: LCSC; Category: Capacitors - MLCC; Supplier Part Number 1: C106999; Tolerance: ±5%; Voltage Rating: 50V; Temperature Coefficient: NP0; RoHS: Yes; ComponentLink1Description: Datasheet; ComponentLink1URL: https://wmsc.lcsc.com/wmsc/upload/file/pdf/v2/lcsc/2304140030_YAGEO-CC0402JRNPO9BN181_C106999.pdf; ComponentLink2Description: JLCPCB Part URL; ComponentLink2URL: https://jlcpcb.com/partdetail/C106999; ComponentLink3Description: LCSC Part URL; ComponentLink3URL: https://lcsc.com/product-detail/Multilayer-Ceramic-Capacitors-MLCC---SMD-SMT_YAGEO-YAGEO-CC0402JRNPO9BN181_C106999.html
footprint CAP-0402 (0402 (1005M) Capacitor)
pins: 1, 2

## CC0402JRNPO9BN200
designator C?  Capacitance: 20pF  (hidden comment: *)
Capacitor, Ceramic (MLCC), 20pF, ±5%, 50V, NP0, ±5%, SMD 0402; Manufacturer: YAGEO; Manufacturer Part Number: CC0402JRNPO9BN200; Package Size: 0402; JLCPCB Basic Part: No; JLCPCB Part Number: C107000; Supplier 1: LCSC; Category: Capacitors - MLCC; Supplier Part Number 1: C107000; Tolerance: ±5%; Voltage Rating: 50V; Temperature Coefficient: NP0; RoHS: Yes; ComponentLink1Description: Datasheet; ComponentLink1URL: https://wmsc.lcsc.com/wmsc/upload/file/pdf/v2/lcsc/2304140030_YAGEO-CC0402JRNPO9BN200_C107000.pdf; ComponentLink2Description: JLCPCB Part URL; ComponentLink2URL: https://jlcpcb.com/partdetail/C107000; ComponentLink3Description: LCSC Part URL; ComponentLink3URL: https://lcsc.com/product-detail/Multilayer-Ceramic-Capacitors-MLCC---SMD-SMT_YAGEO-YAGEO-CC0402JRNPO9BN200_C107000.html
footprint CAP-0402 (0402 (1005M) Capacitor)
pins: 1, 2

## CC0402JRNPO9BN201
designator C?  Capacitance: 200pF  (hidden comment: *)
Capacitor, Ceramic (MLCC), 200pF, ±5%, 50V, NP0, ±5%, SMD 0402; Manufacturer: YAGEO; Manufacturer Part Number: CC0402JRNPO9BN201; Package Size: 0402; JLCPCB Basic Part: No; JLCPCB Part Number: C325462; Supplier 1: LCSC; Category: Capacitors - MLCC; Supplier Part Number 1: C325462; Tolerance: ±5%; Voltage Rating: 50V; Temperature Coefficient: NP0; RoHS: Yes; ComponentLink1Description: Datasheet; ComponentLink1URL: https://wmsc.lcsc.com/wmsc/upload/file/pdf/v2/lcsc/1811070918_YAGEO-CC0402JRNPO9BN201_C325462.pdf; ComponentLink2Description: JLCPCB Part URL; ComponentLink2URL: https://jlcpcb.com/partdetail/C325462; ComponentLink3Description: LCSC Part URL; ComponentLink3URL: https://lcsc.com/product-detail/Multilayer-Ceramic-Capacitors-MLCC---SMD-SMT_YAGEO-YAGEO-CC0402JRNPO9BN201_C325462.html
footprint CAP-0402 (0402 (1005M) Capacitor)
pins: 1, 2

## CC0402JRNPO9BN220
designator C?  Capacitance: 22pF  (hidden comment: *)
Capacitor, Ceramic (MLCC), 22pF, ±5%, 50V, NP0, ±5%, SMD 0402; Manufacturer: YAGEO; Manufacturer Part Number: CC0402JRNPO9BN220; Package Size: 0402; JLCPCB Basic Part: No; JLCPCB Part Number: C106203; Supplier 1: LCSC; Category: Capacitors - MLCC; Supplier Part Number 1: C106203; Tolerance: ±5%; Voltage Rating: 50V; Temperature Coefficient: NP0; RoHS: Yes; ComponentLink1Description: Datasheet; ComponentLink1URL: https://wmsc.lcsc.com/wmsc/upload/file/pdf/v2/lcsc/2304140030_YAGEO-CC0402JRNPO9BN220_C106203.pdf; ComponentLink2Description: JLCPCB Part URL; ComponentLink2URL: https://jlcpcb.com/partdetail/C106203; ComponentLink3Description: LCSC Part URL; ComponentLink3URL: https://lcsc.com/product-detail/Multilayer-Ceramic-Capacitors-MLCC---SMD-SMT_YAGEO-YAGEO-CC0402JRNPO9BN220_C106203.html
footprint CAP-0402 (0402 (1005M) Capacitor)
pins: 1, 2

## CC0402JRNPO9BN221
designator C?  Capacitance: 220pF  (hidden comment: *)
Capacitor, Ceramic (MLCC), 220pF, ±5%, 50V, NP0, ±5%, SMD 0402; Manufacturer: YAGEO; Manufacturer Part Number: CC0402JRNPO9BN221; Package Size: 0402; JLCPCB Basic Part: No; JLCPCB Part Number: C107001; Supplier 1: LCSC; Category: Capacitors - MLCC; Supplier Part Number 1: C107001; Tolerance: ±5%; Voltage Rating: 50V; Temperature Coefficient: NP0; RoHS: Yes; ComponentLink1Description: Datasheet; ComponentLink1URL: https://wmsc.lcsc.com/wmsc/upload/file/pdf/v2/lcsc/2304140030_YAGEO-CC0402JRNPO9BN221_C107001.pdf; ComponentLink2Description: JLCPCB Part URL; ComponentLink2URL: https://jlcpcb.com/partdetail/C107001; ComponentLink3Description: LCSC Part URL; ComponentLink3URL: https://lcsc.com/product-detail/Multilayer-Ceramic-Capacitors-MLCC---SMD-SMT_YAGEO-YAGEO-CC0402JRNPO9BN221_C107001.html
footprint CAP-0402 (0402 (1005M) Capacitor)
pins: 1, 2

## CC0402JRNPO9BN240
designator C?  Capacitance: 24pF  (hidden comment: *)
Capacitor, Ceramic (MLCC), 24pF, ±5%, 50V, NP0, ±5%, SMD 0402; Manufacturer: YAGEO; Manufacturer Part Number: CC0402JRNPO9BN240; Package Size: 0402; JLCPCB Basic Part: No; JLCPCB Part Number: C281755; Supplier 1: LCSC; Category: Capacitors - MLCC; Supplier Part Number 1: C281755; Tolerance: ±5%; Voltage Rating: 50V; Temperature Coefficient: NP0; RoHS: Yes; ComponentLink1Description: Datasheet; ComponentLink1URL: https://wmsc.lcsc.com/wmsc/upload/file/pdf/v2/lcsc/2304140030_YAGEO-CC0402JRNPO9BN240_C281755.pdf; ComponentLink2Description: JLCPCB Part URL; ComponentLink2URL: https://jlcpcb.com/partdetail/C281755; ComponentLink3Description: LCSC Part URL; ComponentLink3URL: https://lcsc.com/product-detail/Multilayer-Ceramic-Capacitors-MLCC---SMD-SMT_YAGEO-YAGEO-CC0402JRNPO9BN240_C281755.html
footprint CAP-0402 (0402 (1005M) Capacitor)
pins: 1, 2

## CC0402JRNPO9BN250
designator C?  Capacitance: 25pF  (hidden comment: *)
Capacitor, Ceramic (MLCC), 25pF, ±5%, 50V, NP0, ±5%, SMD 0402; Manufacturer: YAGEO; Manufacturer Part Number: CC0402JRNPO9BN250; Package Size: 0402; JLCPCB Basic Part: No; JLCPCB Part Number: C541363; Supplier 1: LCSC; Category: Capacitors - MLCC; Supplier Part Number 1: C541363; Tolerance: ±5%; Voltage Rating: 50V; Temperature Coefficient: NP0; RoHS: Yes; ComponentLink1Description: Datasheet; ComponentLink1URL: https://wmsc.lcsc.com/wmsc/upload/file/pdf/v2/lcsc/2006151112_YAGEO-CC0402JRNPO9BN250_C541363.pdf; ComponentLink2Description: JLCPCB Part URL; ComponentLink2URL: https://jlcpcb.com/partdetail/C541363; ComponentLink3Description: LCSC Part URL; ComponentLink3URL: https://lcsc.com/product-detail/Multilayer-Ceramic-Capacitors-MLCC---SMD-SMT_YAGEO-YAGEO-CC0402JRNPO9BN250_C541363.html
footprint CAP-0402 (0402 (1005M) Capacitor)
pins: 1, 2

## CC0402JRNPO9BN270
designator C?  Capacitance: 27pF  (hidden comment: *)
Capacitor, Ceramic (MLCC), 27pF, ±5%, 50V, NP0, ±5%, SMD 0402; Manufacturer: YAGEO; Manufacturer Part Number: CC0402JRNPO9BN270; Package Size: 0402; JLCPCB Basic Part: No; JLCPCB Part Number: C107002; Supplier 1: LCSC; Category: Capacitors - MLCC; Supplier Part Number 1: C107002; Tolerance: ±5%; Voltage Rating: 50V; Temperature Coefficient: NP0; RoHS: Yes; ComponentLink1Description: Datasheet; ComponentLink1URL: https://wmsc.lcsc.com/wmsc/upload/file/pdf/v2/lcsc/2304140030_YAGEO-CC0402JRNPO9BN270_C107002.pdf; ComponentLink2Description: JLCPCB Part URL; ComponentLink2URL: https://jlcpcb.com/partdetail/C107002; ComponentLink3Description: LCSC Part URL; ComponentLink3URL: https://lcsc.com/product-detail/Multilayer-Ceramic-Capacitors-MLCC---SMD-SMT_YAGEO-YAGEO-CC0402JRNPO9BN270_C107002.html
footprint CAP-0402 (0402 (1005M) Capacitor)
pins: 1, 2

## CC0402JRNPO9BN271
designator C?  Capacitance: 270pF  (hidden comment: *)
Capacitor, Ceramic (MLCC), 270pF, ±5%, 50V, NP0, ±5%, SMD 0402; Manufacturer: YAGEO; Manufacturer Part Number: CC0402JRNPO9BN271; Package Size: 0402; JLCPCB Basic Part: No; JLCPCB Part Number: C107003; Supplier 1: LCSC; Category: Capacitors - MLCC; Supplier Part Number 1: C107003; Tolerance: ±5%; Voltage Rating: 50V; Temperature Coefficient: NP0; RoHS: Yes; ComponentLink1Description: Datasheet; ComponentLink1URL: https://wmsc.lcsc.com/wmsc/upload/file/pdf/v2/lcsc/2304140030_YAGEO-CC0402JRNPO9BN271_C107003.pdf; ComponentLink2Description: JLCPCB Part URL; ComponentLink2URL: https://jlcpcb.com/partdetail/C107003; ComponentLink3Description: LCSC Part URL; ComponentLink3URL: https://lcsc.com/product-detail/Multilayer-Ceramic-Capacitors-MLCC---SMD-SMT_YAGEO-YAGEO-CC0402JRNPO9BN271_C107003.html
footprint CAP-0402 (0402 (1005M) Capacitor)
pins: 1, 2

## CC0402JRNPO9BN300
designator C?  Capacitance: 30pF  (hidden comment: *)
Capacitor, Ceramic (MLCC), 30pF, ±5%, 50V, NP0, ±5%, SMD 0402; Manufacturer: YAGEO; Manufacturer Part Number: CC0402JRNPO9BN300; Package Size: 0402; JLCPCB Basic Part: No; JLCPCB Part Number: C107004; Supplier 1: LCSC; Category: Capacitors - MLCC; Supplier Part Number 1: C107004; Tolerance: ±5%; Voltage Rating: 50V; Temperature Coefficient: NP0; RoHS: Yes; ComponentLink1Description: Datasheet; ComponentLink1URL: https://wmsc.lcsc.com/wmsc/upload/file/pdf/v2/lcsc/2304140030_YAGEO-CC0402JRNPO9BN300_C107004.pdf; ComponentLink2Description: JLCPCB Part URL; ComponentLink2URL: https://jlcpcb.com/partdetail/C107004; ComponentLink3Description: LCSC Part URL; ComponentLink3URL: https://lcsc.com/product-detail/Multilayer-Ceramic-Capacitors-MLCC---SMD-SMT_YAGEO-YAGEO-CC0402JRNPO9BN300_C107004.html
footprint CAP-0402 (0402 (1005M) Capacitor)
pins: 1, 2

## CC0402JRNPO9BN330
designator C?  Capacitance: 33pF  (hidden comment: *)
Capacitor, Ceramic (MLCC), 33pF, ±5%, 50V, NP0, ±5%, SMD 0402; Manufacturer: YAGEO; Manufacturer Part Number: CC0402JRNPO9BN330; Package Size: 0402; JLCPCB Basic Part: No; JLCPCB Part Number: C107005; Supplier 1: LCSC; Category: Capacitors - MLCC; Supplier Part Number 1: C107005; Tolerance: ±5%; Voltage Rating: 50V; Temperature Coefficient: NP0; RoHS: Yes; ComponentLink1Description: Datasheet; ComponentLink1URL: https://wmsc.lcsc.com/wmsc/upload/file/pdf/v2/lcsc/2304140030_YAGEO-CC0402JRNPO9BN330_C107005.pdf; ComponentLink2Description: JLCPCB Part URL; ComponentLink2URL: https://jlcpcb.com/partdetail/C107005; ComponentLink3Description: LCSC Part URL; ComponentLink3URL: https://lcsc.com/product-detail/Multilayer-Ceramic-Capacitors-MLCC---SMD-SMT_YAGEO-YAGEO-CC0402JRNPO9BN330_C107005.html
footprint CAP-0402 (0402 (1005M) Capacitor)
pins: 1, 2

## CC0402JRNPO9BN331
designator C?  Capacitance: 330pF  (hidden comment: *)
Capacitor, Ceramic (MLCC), 330pF, ±5%, 50V, NP0, ±5%, SMD 0402; Manufacturer: YAGEO; Manufacturer Part Number: CC0402JRNPO9BN331; Package Size: 0402; JLCPCB Basic Part: No; JLCPCB Part Number: C107006; Supplier 1: LCSC; Category: Capacitors - MLCC; Supplier Part Number 1: C107006; Tolerance: ±5%; Voltage Rating: 50V; Temperature Coefficient: NP0; RoHS: Yes; ComponentLink1Description: Datasheet; ComponentLink1URL: https://wmsc.lcsc.com/wmsc/upload/file/pdf/v2/lcsc/2304140030_YAGEO-CC0402JRNPO9BN331_C107006.pdf; ComponentLink2Description: JLCPCB Part URL; ComponentLink2URL: https://jlcpcb.com/partdetail/C107006; ComponentLink3Description: LCSC Part URL; ComponentLink3URL: https://lcsc.com/product-detail/Multilayer-Ceramic-Capacitors-MLCC---SMD-SMT_YAGEO-YAGEO-CC0402JRNPO9BN331_C107006.html
footprint CAP-0402 (0402 (1005M) Capacitor)
pins: 1, 2
